# Altium footprint library Miscellaneous Base.PcbLib: 153 footprints (part 8 of 10)
Each footprint in its own frame and in the unit in brackets; x right, y up, seen from the top. Pads: shape width x height; smd on the part's side, far side on the other; paste and mask are expansions set on the pad; w line width, h text height; cw(c..) or ccw(c..) is an arc to the next point about the centre after c.
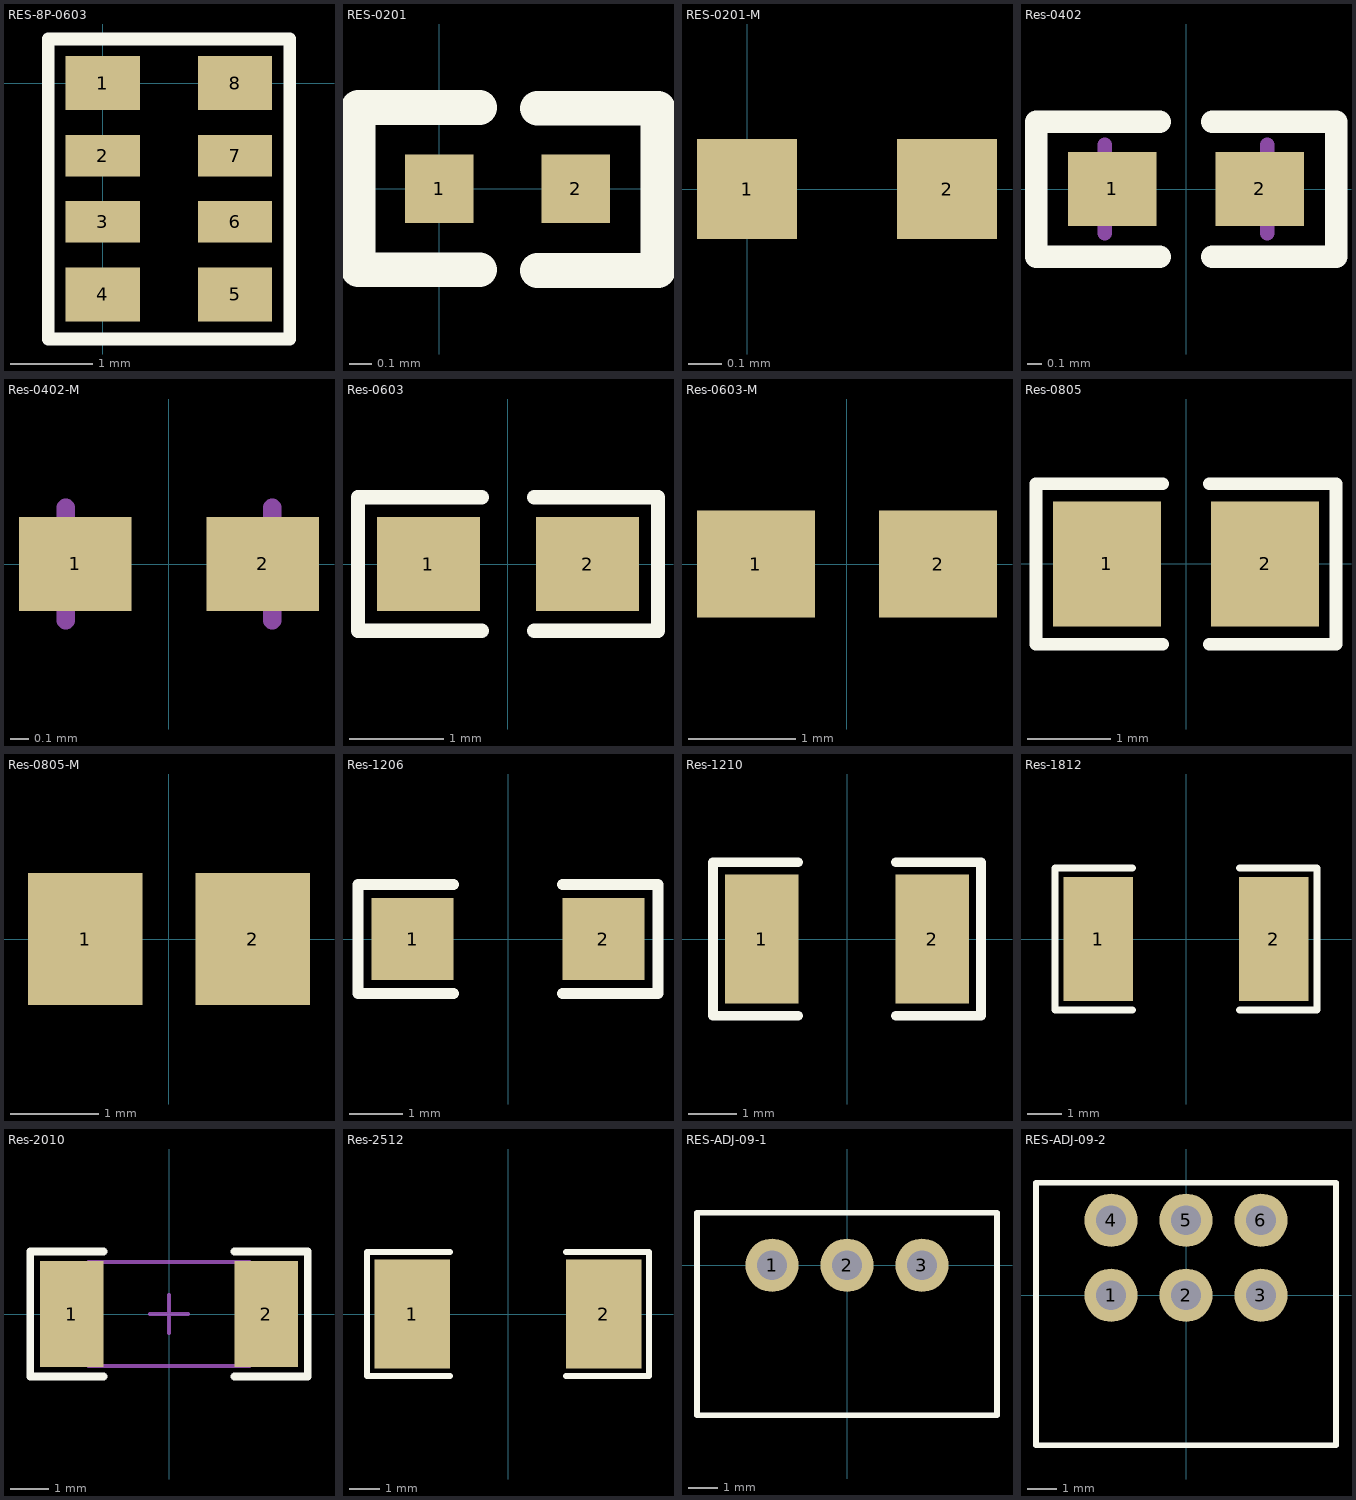
[diagram p7: the footprints below, top view; thin cyan lines are the x and y axes]

## RES-8P-0603 [mm]
pads (8):
  rect 0.9x0.65 smd: 1(0,0) 4(0,-2.56) 5(1.6,-2.56) 8(1.6,0)
  rect 0.9x0.5 smd: 2(0,-0.88) 3(0,-1.68) 6(1.6,-1.68) 7(1.6,-0.88)
Top Overlay:
  lines w0.152: -0.66,-3.099 -0.66,0.533 2.261,0.533 2.261,-3.099 -0.66,-3.099
3D body "8P4R-0603.STEP": height 0.6, standoff 0, extent 0.051,-2.87 1.651,0.33

## RES-0201 [mm]
pads (2):
  rect 0.3x0.3 smd: 1(0,0) 2(0.6,0)
Top Overlay:
  lines w0.152: 0.178,-0.356 -0.356,-0.356 -0.356,0.356 0.178,0.356 ; 0.432,-0.358 0.96,-0.358 0.96,0.353 0.432,0.353
3D body "User Library-Chip Resistor2.STEP": height 0.28, standoff -0.02, extent 0.005,-0.133 0.605,0.127

## RES-0201-M [mm]
pads (2):
  rect 0.3x0.3 smd: 1(0,0) 2(0.6,0)
3D body "User Library-Chip Resistor2.STEP": height 0.28, standoff -0.02, extent 0.005,-0.133 0.605,0.127

## Res-0402 [mm]
height 1.3
pads (2):
  rect 0.6x0.5 smd: 1(-0.5,0) 2(0.5,0)
Top Overlay:
  lines w0.152: -0.178,-0.457 -1.016,-0.457 -1.016,0.457 -0.178,0.457 ; 0.178,-0.457 1.016,-0.457 1.016,0.457 0.178,0.457
Mechanical 13:
  lines w0.1: -0.55,-0.3 -0.55,0.3 ; 0.55,-0.3 0.55,0.3
3D body "RESC1005(0402).STEP": height 0.38, standoff 0, extent -0.5,-0.25 0.5,0.25

## Res-0402-M [mm]
height 1.3
pads (2):
  rect 0.6x0.5 smd: 1(-0.5,0) 2(0.5,0)
Mechanical 13:
  lines w0.1: -0.55,-0.3 -0.55,0.3 ; 0.55,-0.3 0.55,0.3
3D body "RESC1005(0402).STEP": height 0.38, standoff 0, extent -0.5,-0.25 0.5,0.25

## Res-0603 [mm]
height 0.6
pads (2):
  rect 1.1x1 smd: 1(-0.85,0) 2(0.85,0)
Top Overlay:
  lines w0.152: -0.279,-0.711 -1.6,-0.711 -1.6,0.711 -0.279,0.711 ; 0.279,-0.711 1.6,-0.711 1.6,0.711 0.279,0.711
3D body "RESC1608(0603).STEP": height 0.38, standoff 0, extent -0.8,-0.4 0.8,0.4

## Res-0603-M [mm]
height 0.6
pads (2):
  rect 1.1x1 smd: 1(-0.85,0) 2(0.85,0)
3D body "RESC1608(0603).STEP": height 0.38, standoff 0, extent -0.8,-0.4 0.8,0.4

## Res-0805 [mm]
height 1.1
pads (2):
  rect 1.3x1.5 smd: 1(-0.95,0) 2(0.95,0)
Top Overlay:
  lines w0.152: -0.279,-0.965 -1.803,-0.965 -1.803,0.965 -0.279,0.965 ; 0.279,-0.965 1.803,-0.965 1.803,0.965 0.279,0.965
3D body "RESC2012(0805).STEP": height 0.5, standoff 0, extent -1,-0.6 1,0.6

## Res-0805-M [mm]
height 1.1
pads (2):
  rect 1.3x1.5 smd: 1(-0.95,0) 2(0.95,0)
3D body "RESC2012(0805).STEP": height 0.5, standoff 0, extent -1,-0.6 1,0.6

## Res-1206 [mil]
height 59.06
pads (2):
  rect 60x60 smd: 1(-70,0) 2(70,0)
Top Overlay:
  lines w7.87: -40,-40 -110,-40 -110,40 -40,40 ; 40,-40 110,-40 110,40 40,40
3D body "RESC3216(1206).STEP": height 23.62, standoff 0, extent -62.99,-31.49 63,31.5

## Res-1210 [mil]
height 59.06
pads (2):
  rect 60x106.3 smd: 1(-70,0) 2(70,0)
Top Overlay:
  lines w7.87: -40,-63 -110,-63 -110,63 -40,63 ; 40,-63 110,-63 110,63 40,63
3D body "RESC3225(1210).STEP": height 23.62, standoff 0, extent -62.99,-49.21 63,49.22

## Res-1812 [mm]
height 1
pads (2):
  rect 2x3.6 smd: 1(-2.54,0) 2(2.54,0)
Top Overlay:
  lines w0.2: -1.549,-2.057 -3.785,-2.057 -3.785,2.057 -1.549,2.057 ; 1.549,-2.057 3.785,-2.057 3.785,2.057 1.549,2.057
3D body "RESC4532(1812).STEP": height 0.7, standoff 0, extent -2.25,-1.6 2.25,1.6

## Res-2010 [mm]
height 0.6
pads (2):
  rect 1.65x2.75 smd: 1(-2.525,0) 2(2.525,0)
Top Overlay:
  lines w0.2: -1.702,-1.626 -3.607,-1.626 -3.607,1.626 -1.702,1.626 ; 1.702,-1.626 3.607,-1.626 3.607,1.626 1.702,1.626
Mechanical 13:
  lines w0.1: -2.1,-1.35 2.1,-1.35 2.1,1.35 -2.1,1.35 -2.1,-1.35
Mechanical 15:
  lines w0.1: -0.5,0 0.5,0 ; 0,-0.5 0,0.5
3D body "RESC5025(2010).STEP": height 0.65, standoff 0, extent -2.5,-1.25 2.5,1.25

## Res-2512 [mm]
height 1
pads (2):
  rect 2.5x3.6 smd: 1(-3.175,0) 2(3.175,0)
Top Overlay:
  lines w0.2: -1.93,-2.057 -4.674,-2.057 -4.674,2.057 -1.93,2.057 ; 1.93,-2.057 4.674,-2.057 4.674,2.057 1.93,2.057
3D body "RESC6432(2512).STEP": height 0.7, standoff 0, extent -3.2,-1.6 3.2,1.6

## RES-ADJ-09-1 [mm]
pads (3):
  round 1.8 hole 1: 1(-2.54,0) 2(0,0) 3(2.54,0)
Top Overlay:
  lines w0.2: -5.08,-5.08 -5.08,1.778 5.08,1.778 5.08,-5.08 -5.08,-5.08
3D body: height 3, standoff 0, extent 2.286,-0.254 2.794,0.254
3D body: height 3, standoff 0, extent -0.254,-0.254 0.254,0.254
3D body: height 3, standoff 0, extent -2.794,-0.254 -2.286,0.254
3D body: height 8.88, standoff 3.82, extent -2.53,-13.08 2.53,-10.08
3D body: height 9.34, standoff 3.36, extent -2.988,-20.08 2.988,-13.08
3D body: height 9.84, standoff 2.86, extent -3.487,-10.08 3.485,-5.08
3D body: height 11, standoff 0, extent -5.08,-5.08 5.08,-3.81
3D body: height 11, standoff 0, extent -5.08,-3.81 5.08,1.778

## RES-ADJ-09-2 [mm]
pads (6):
  round 1.8 hole 1: 1(-2.54,0) 2(0,0) 3(2.54,0) 4(-2.54,2.54) 5(0,2.54) 6(2.54,2.54)
Top Overlay:
  lines w0.2: -5.08,-5.08 5.08,-5.08 5.08,3.81 -5.08,3.81 -5.08,-5.08
3D body: height 3, standoff 0, extent 2.286,2.286 2.794,2.794
3D body: height 3, standoff 0, extent -0.254,2.286 0.254,2.794
3D body: height 3, standoff 0, extent -2.794,2.286 -2.286,2.794
3D body: height 3, standoff 0, extent 2.286,-0.254 2.794,0.254
3D body: height 3, standoff 0, extent -0.254,-0.254 0.254,0.254
3D body: height 3, standoff 0, extent -2.794,-0.254 -2.286,0.254
3D body: height 8.88, standoff 3.82, extent -2.53,-13.08 2.53,-10.08
3D body: height 9.34, standoff 3.36, extent -2.988,-20.08 2.988,-13.08
3D body: height 9.84, standoff 2.86, extent -3.487,-10.08 3.485,-5.08
3D body: height 11, standoff 0, extent -5.08,-5.08 5.08,-3.81
3D body: height 11, standoff 0, extent -5.08,-3.81 5.08,3.81